# Altium footprint library agh_racing_2018.PcbLib: 174 footprints (part 3 of 11)
Each footprint in its own frame and in the unit in brackets; x right, y up, seen from the top. Pads: shape width x height; smd on the part's side, far side on the other; paste and mask are expansions set on the pad; w line width, h text height; cw(c..) or ccw(c..) is an arc to the next point about the centre after c.
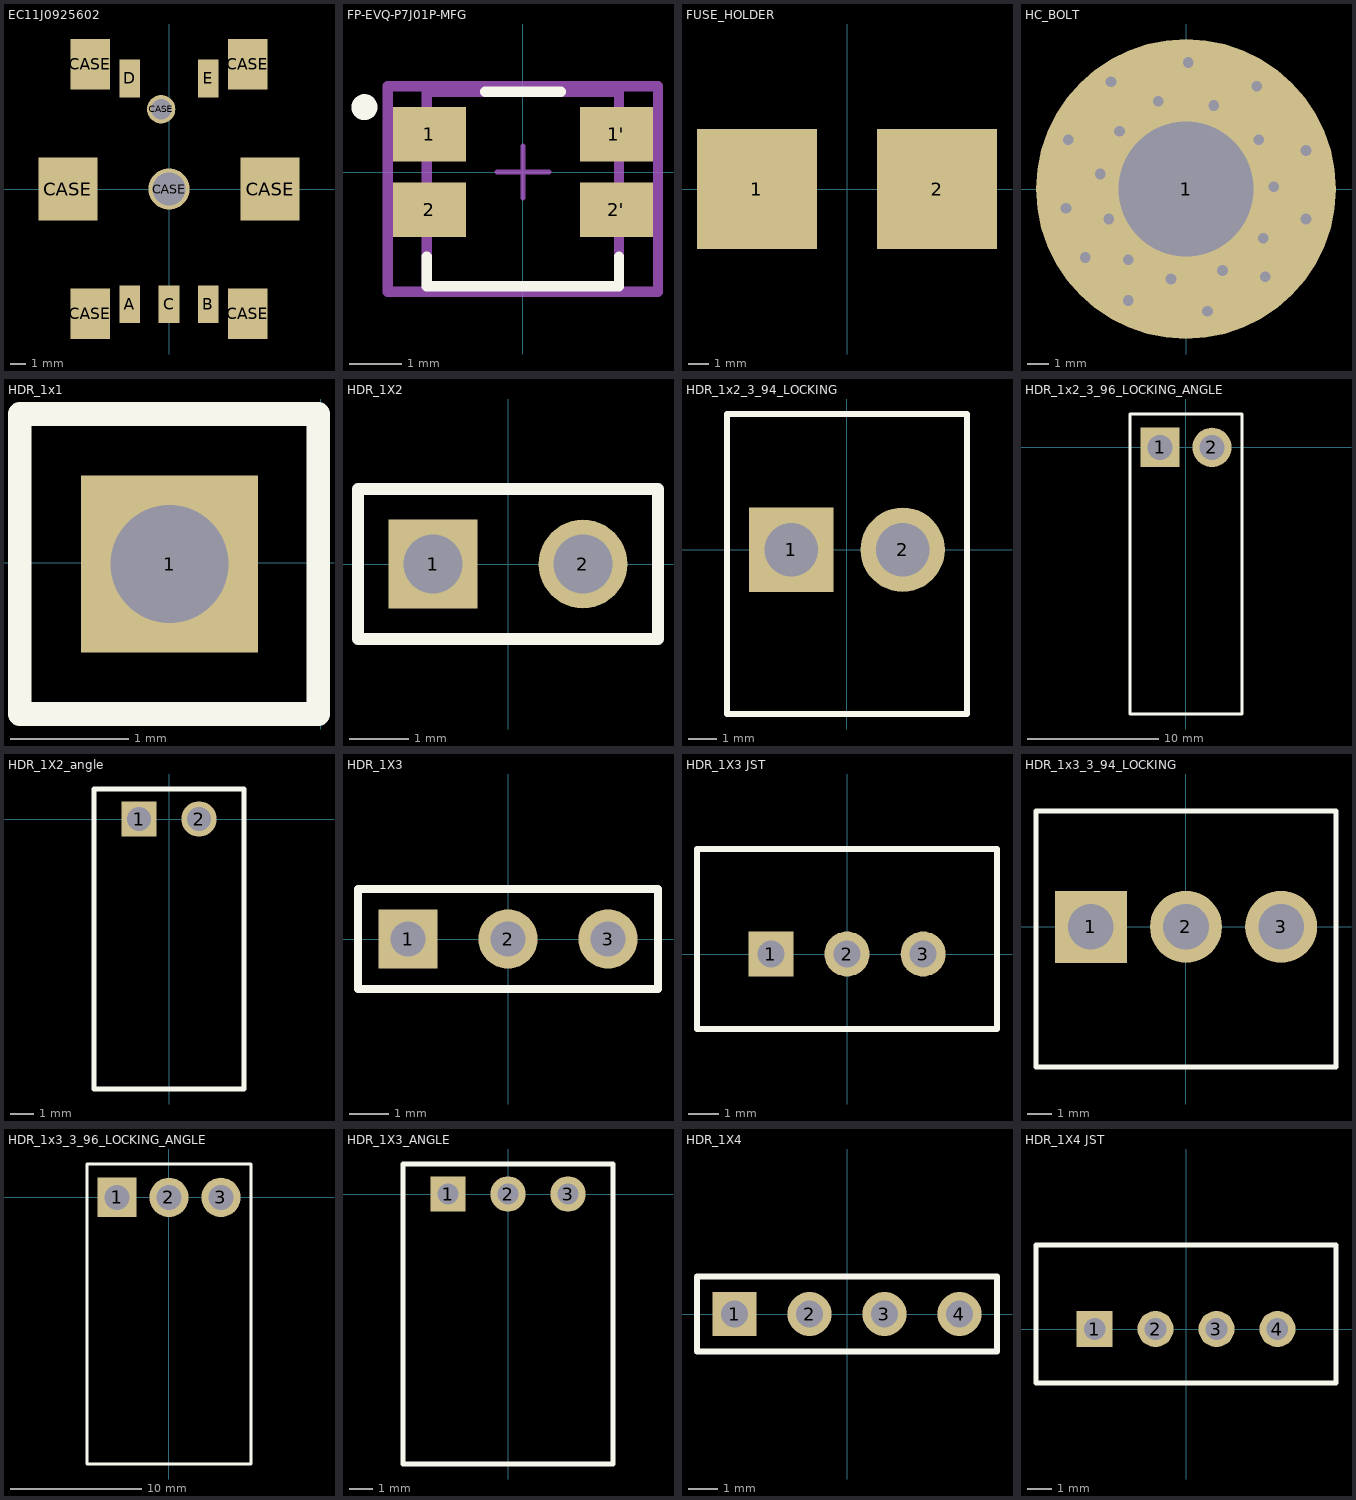
[diagram p2: the footprints below, top view; thin cyan lines are the x and y axes]

## EC11J0925602 [mm] "Encoder, EC11J0925602"
pads (13):
  rect 1.3x2.4 smd: A(-2.5,-7.3) B(2.5,-7.3) C(0,-7.3) D(-2.5,7) E(2.5,7)
  rect 3.75x4 smd: CASE(-6.4,0) CASE(6.4,0)
  rect 2.5x3.2 smd: CASE(-5,-7.9) CASE(-5,7.9) CASE(5,-7.9) CASE(5,7.9)
  round 1.8 hole 1.3: CASE(-0.5,5.05)
  round 2.6 hole 2.1: CASE(0,0)
3D body "EC11J0925403.STEP": height 24.51, standoff -1.19, extent -7.5,-9 7.5,9

## FP-EVQ-P7J01P-MFG [mm]
pads (4):
  rect 1.4x1.05 smd paste+0 mask+0: 1(-1.8,0.725) 1'(1.8,0.725) 2(-1.8,-0.725) 2'(1.8,-0.725)
Top Overlay:
  circle w0.25: c-3.05,1.25 r0.125
  lines w0.2: -1.85,-1.625 -1.85,-2.2 1.85,-2.2 1.85,-1.625 ; -0.725,1.55 0.725,1.55
Courtyard Bottom:
  lines w0.2: -2.6,-2.3 -2.6,1.65 2.6,1.65 2.6,-2.3 -2.6,-2.3
  text ".Designator" at 0,-0.137 h1
Mechanical 13:
  lines w0.2: -1.85,-2.2 -1.85,1.55 1.85,1.55 1.85,-2.2 -1.85,-2.2
Mechanical 15:
  lines w0.2: -2.6,-2.3 -2.6,1.65 2.6,1.65 2.6,-2.3 -2.6,-2.3
Mechanical 16:
  lines w0.1: -0.5,0 0.5,0 ; 0,-0.5 0,0.5
3D body "Switch_Panasonic_EVQ-P7J01P_eec.STEP": height 0.25, standoff 0, extent -2.6,-2.3 2.6,1.65

## FUSE_HOLDER [mm]
pads (2):
  rect 6x6 smd: 1(-4.5,0) 2(4.5,0)
3D body: height 6, standoff 0, extent -7.5,-3 7.5,3

## HC_BOLT [mm] "High current bolt"
height 24.8
pads (1):
  round 14 hole 6.3: 1(0,0)
via 3.3,4.8 diameter 0.75 hole 0.5
via 3.4,2.3 diameter 0.75 hole 0.5
via 5.6,1.8 diameter 0.75 hole 0.5
via -2.7,-5.2 diameter 0.75 hole 0.5
via -4.7,-3.2 diameter 0.75 hole 0.5
via -3.6,-1.4 diameter 0.75 hole 0.5
via -5.6,-0.9 diameter 0.75 hole 0.5
via -4,0.7 diameter 0.75 hole 0.5
via -5.5,2.3 diameter 0.75 hole 0.5
via -3.1,2.7 diameter 0.75 hole 0.5
via -3.5,5 diameter 0.75 hole 0.5
via -1.3,4.1 diameter 0.75 hole 0.5
via -2.7,-3.3 diameter 0.75 hole 0.5
via -0.7,-4.2 diameter 0.75 hole 0.5
via 1.7,-3.8 diameter 0.75 hole 0.5
via 5.6,-1.4 diameter 0.75 hole 0.5
via 4.1,0.1 diameter 0.75 hole 0.5
via 3.6,-2.3 diameter 0.75 hole 0.5
via 3.7,-4.1 diameter 0.75 hole 0.5
via 1,-5.7 diameter 0.75 hole 0.5
via 1.3,3.9 diameter 0.75 hole 0.5
via 0.1,5.9 diameter 0.75 hole 0.5
3D body "bolt.sldprt": height 24.81, standoff -4.99, extent -6,-6.749 6,6.749

## HDR_1x1 [mm]
pads (1):
  rect 1.5x1.5 hole 1: 1(-1.28,-0.01)
Top Overlay:
  lines w0.2: -2.55,-1.28 -0.02,-1.28 -0.02,1.26 -2.55,1.26 -2.55,-1.28
3D body: height 2, standoff 0, extent -2.65,-1.28 -0.01,1.26

## HDR_1X2 [mm] "Connector; Header; 2 Position"
pads (2):
  rect 1.5x1.5 hole 1: 1(-1.27,0)
  round 1.5 hole 1: 2(1.27,0)
Top Overlay:
  lines w0.2: -2.54,-1.27 2.54,-1.27 2.54,1.27 -2.54,1.27 -2.54,-1.27
3D body "DS1021-1x2SF11.stp": height 8.6, standoff -3, extent -2.54,-1.27 2.54,1.27

## HDR_1x2_3_94_LOCKING [mm]
pads (2):
  rect 3x3 hole 1.9: 1(-1.98,0)
  round 3 hole 1.9: 2(1.98,0)
Top Overlay:
  lines w0.2: -4.266,-5.842 -4.266,4.826 4.266,4.826 4.266,-5.842 -4.266,-5.842

## HDR_1x2_3_96_LOCKING_ANGLE [mm]
pads (2):
  rect 3x3 hole 1.9: 1(-1.98,0)
  round 3 hole 1.9: 2(1.98,0)
Top Overlay:
  lines w0.2: -4.266,-20.32 4.266,-20.32 4.266,2.54 -4.266,2.54 -4.266,-20.32
3D body "1718140002.stp": height 10.01, standoff -2.54, extent -3.886,-20.045 3.886,0.554

## HDR_1X2_angle [mm] "Connector; Header; 2 Position"
pads (2):
  rect 1.5x1.5 hole 1: 1(-1.27,0)
  round 1.5 hole 1: 2(1.27,0)
Top Overlay:
  lines w0.2: -3.175,-11.43 -3.175,1.27 3.175,1.27 3.175,-11.43 -3.175,-11.43
3D body "c-0640457-02-s-3d.stp": height 5.84, standoff -3.55, extent -2.54,-10.733 2.54,0.316

## HDR_1X3 [mm] "Connector; Header; 3 Position"
pads (3):
  rect 1.5x1.5 hole 0.9: 1(-2.54,0)
  round 1.5 hole 0.9: 2(0,0) 3(2.54,0)
Top Overlay:
  lines w0.2: -3.81,-1.27 3.81,-1.27 3.81,1.27 -3.81,1.27 -3.81,-1.27
3D body "DS1021-1x3SF11.stp": height 8.6, standoff -3, extent -3.81,-1.27 3.81,1.27

## HDR_1X3 JST [mm] "Connector; Header; 3 Position"
pads (3):
  rect 1.5x1.5 hole 0.9: 1(-2.54,0)
  round 1.5 hole 0.9: 2(0,0) 3(2.54,0)
Top Overlay:
  lines w0.2: -5,-2.5 5,-2.5 5,3.5 -5,3.5 -5,-2.5
3D body "JST XH 3 B3B-XH-A.STEP": height 7, standoff -3.45, extent -4.93,-2.35 4.93,3.4

## HDR_1x3_3_94_LOCKING [mm]
pads (3):
  rect 3x3 hole 1.9: 1(-3.96,0)
  round 3 hole 1.9: 2(0,0) 3(3.96,0)
Top Overlay:
  lines w0.2: -6.246,-5.842 6.246,-5.842 6.246,4.826 -6.246,4.826 -6.246,-5.842

## HDR_1x3_3_96_LOCKING_ANGLE [mm]
pads (3):
  rect 3x3 hole 1.9: 1(-3.96,0)
  round 3 hole 1.9: 2(0,0) 3(3.96,0)
Top Overlay:
  lines w0.2: -6.246,-20.32 -6.246,2.54 6.246,2.54 6.246,-20.32 -6.246,-20.32
3D body "1718140003.stp": height 10.01, standoff -2.54, extent -5.867,-20.045 5.867,0.554

## HDR_1X3_ANGLE [mm] "Connector; Header; 3 Position"
pads (3):
  rect 1.5x1.5 hole 0.9: 1(-2.54,0)
  round 1.5 hole 0.9: 2(0,0) 3(2.54,0)
Top Overlay:
  lines w0.2: -4.445,-11.43 -4.445,1.27 4.445,1.27 4.445,-11.43 -4.445,-11.43
3D body "c-0640457-03-s-3d.stp": height 5.84, standoff -3.55, extent -3.81,-10.733 3.81,0.316

## HDR_1X4 [mm] "Connector; Header; 4 Position"
pads (4):
  rect 1.5x1.5 hole 0.9: 1(-3.81,0)
  round 1.5 hole 0.9: 2(-1.27,0) 3(1.27,0) 4(3.81,0)
Top Overlay:
  lines w0.2: -5.08,-1.27 5.08,-1.27 5.08,1.27 -5.08,1.27 -5.08,-1.27
3D body "DS1021-1x4SF11.stp": height 8.6, standoff -3, extent -5.08,-1.27 5.08,1.27

## HDR_1X4 JST [mm] "Connector; Header; 4 Position"
pads (4):
  rect 1.5x1.5 hole 0.9: 1(-3.81,0)
  round 1.5 hole 0.9: 2(-1.27,0) 3(1.27,0) 4(3.81,0)
Top Overlay:
  lines w0.2: -6.25,-2.25 6.25,-2.25 6.25,3.5 -6.25,3.5 -6.25,-2.25
3D body "JST XH 4 B4B-XH-A.STEP": height 7, standoff -3.45, extent -6.2,-2.35 6.2,3.4